# Altium footprint library connectors_micromatch.PcbLib: 36 footprints (part 1 of 3)
Each footprint in its own frame and in the unit in brackets; x right, y up, seen from the top. Pads: shape width x height; smd on the part's side, far side on the other; paste and mask are expansions set on the pad; w line width, h text height; cw(c..) or ccw(c..) is an arc to the next point about the centre after c.
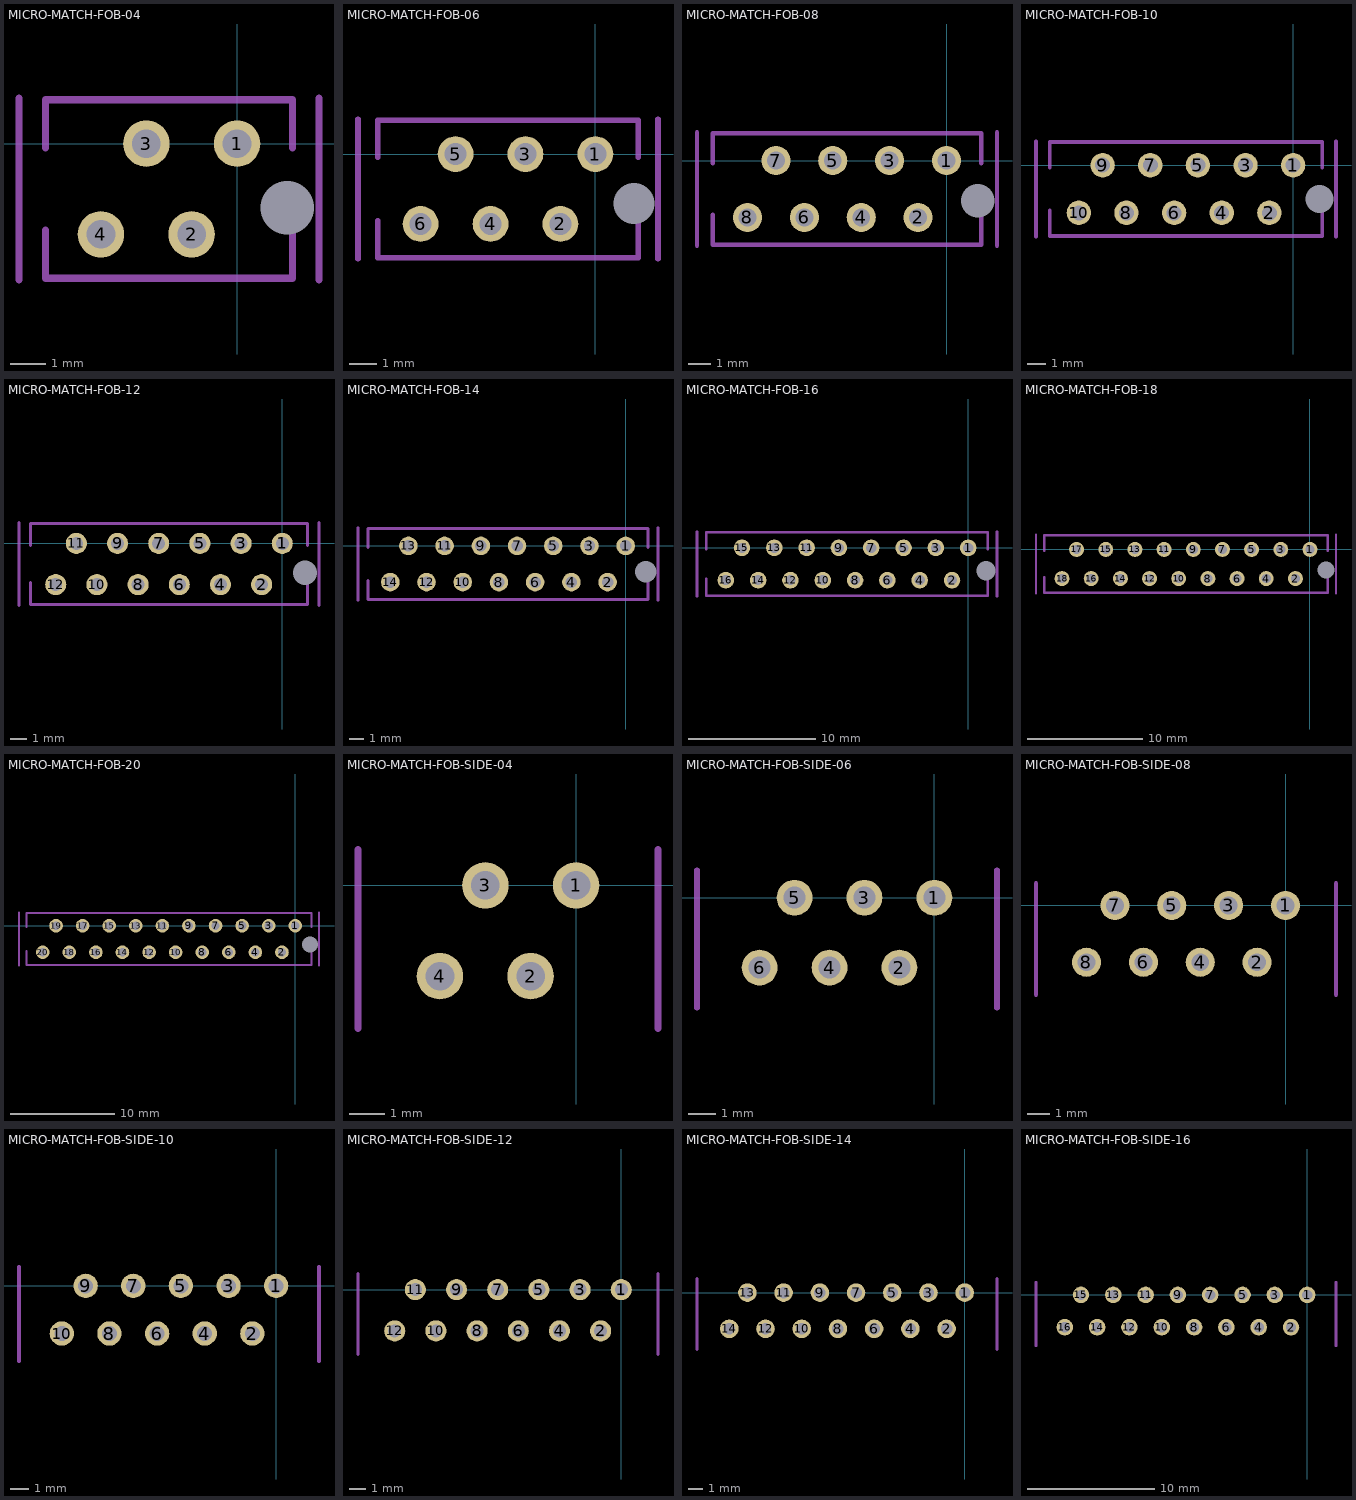
[diagram p0: the footprints below, top view; thin cyan lines are the x and y axes]

## MICRO-MATCH-FOB-04 [mm]
height 4
pads (5):
  round 1.3 hole 0.8: 1(0,0) 2(-1.27,-2.54) 3(-2.54,0) 4(-3.81,-2.54)
  round 0 hole 1.5 unplated: drill(1.4,-1.8)
Mechanical 13:
  lines w0.2: -6.105,-3.81 -6.105,1.27 ; -5.365,-2.42 -5.365,-3.77 1.555,-3.77 1.555,-2.42 ; -5.365,-0.12 -5.365,1.23 1.555,1.23 1.555,-0.12 ; 2.295,-3.81 2.295,1.27
3D body "micromatch_fob_4.STEP": height 4, standoff -3, extent -5.41,-3.77 1.6,1.23

## MICRO-MATCH-FOB-06 [mm]
height 4
pads (7):
  round 1.3 hole 0.8: 1(0,0) 2(-1.27,-2.54) 3(-2.54,0) 4(-3.81,-2.54) 5(-5.08,0) 6(-6.35,-2.54)
  round 0 hole 1.5 unplated: drill(1.4,-1.8)
Mechanical 13:
  lines w0.2: -8.625,-3.81 -8.625,1.27 ; -7.905,-2.42 -7.905,-3.77 1.555,-3.77 1.555,-2.42 ; -7.905,-0.12 -7.905,1.23 1.555,1.23 1.555,-0.12 ; 2.275,-3.81 2.275,1.27
3D body "micromatch_fob_6.STEP": height 4, standoff -3, extent -7.95,-3.77 1.6,1.23

## MICRO-MATCH-FOB-08 [mm]
height 4
pads (9):
  round 1.3 hole 0.8: 1(0,0) 2(-1.27,-2.54) 3(-2.54,0) 4(-3.81,-2.54) 5(-5.08,0) 6(-6.35,-2.54) 7(-7.62,0) 8(-8.89,-2.54)
  round 0 hole 1.5 unplated: drill(1.4,-1.8)
Mechanical 13:
  lines w0.2: -11.145,-3.81 -11.145,1.27 ; -10.445,-2.42 -10.445,-3.77 1.555,-3.77 1.555,-2.42 ; -10.445,-0.12 -10.445,1.23 1.555,1.23 1.555,-0.12 ; 2.255,-3.81 2.255,1.27
3D body "micromatch_fob_8.STEP": height 4, standoff -3, extent -10.49,-3.77 1.6,1.23

## MICRO-MATCH-FOB-10 [mm]
height 4
pads (11):
  round 1.3 hole 0.8: 1(0,0) 2(-1.27,-2.54) 3(-2.54,0) 4(-3.81,-2.54) 5(-5.08,0) 6(-6.35,-2.54) 7(-7.62,0) 8(-8.89,-2.54) 9(-10.16,0) 10(-11.43,-2.54)
  round 0 hole 1.5 unplated: drill(1.4,-1.8)
Mechanical 13:
  lines w0.2: -13.715,-3.81 -13.715,1.27 ; -12.985,-2.42 -12.985,-3.77 1.555,-3.77 1.555,-2.42 ; -12.985,-0.12 -12.985,1.23 1.555,1.23 1.555,-0.12 ; 2.285,-3.81 2.285,1.27
3D body "micromatch_fob_10.STEP": height 4, standoff -3, extent -13.03,-3.77 1.6,1.23

## MICRO-MATCH-FOB-12 [mm]
height 4
pads (13):
  round 1.3 hole 0.8: 1(0,0) 2(-1.27,-2.54) 3(-2.54,0) 4(-3.81,-2.54) 5(-5.08,0) 6(-6.35,-2.54) 7(-7.62,0) 8(-8.89,-2.54) 9(-10.16,0) 10(-11.43,-2.54) 11(-12.7,0) 12(-13.97,-2.54)
  round 0 hole 1.5 unplated: drill(1.4,-1.8)
Mechanical 13:
  lines w0.2: -16.235,-3.81 -16.235,1.27 ; -15.525,-2.42 -15.525,-3.77 1.555,-3.77 1.555,-2.42 ; -15.525,-0.12 -15.525,1.23 1.555,1.23 1.555,-0.12 ; 2.265,-3.81 2.265,1.27
3D body "micromatch_fob_12.STEP": height 4, standoff -3, extent -15.57,-3.77 1.6,1.23

## MICRO-MATCH-FOB-14 [mm]
height 4
pads (15):
  round 1.3 hole 0.8: 1(0,0) 2(-1.27,-2.54) 3(-2.54,0) 4(-3.81,-2.54) 5(-5.08,0) 6(-6.35,-2.54) 7(-7.62,0) 8(-8.89,-2.54) 9(-10.16,0) 10(-11.43,-2.54) 11(-12.7,0) 12(-13.97,-2.54) 13(-15.24,0) 14(-16.51,-2.54)
  round 0 hole 1.5 unplated: drill(1.4,-1.8)
Mechanical 13:
  lines w0.2: -18.775,-3.81 -18.775,1.27 ; -18.065,-2.42 -18.065,-3.77 1.555,-3.77 1.555,-2.42 ; -18.065,-0.12 -18.065,1.23 1.555,1.23 1.555,-0.12 ; 2.265,-3.81 2.265,1.27
3D body "micromatch_fob_14.STEP": height 4, standoff -3, extent -18.11,-3.77 1.6,1.23

## MICRO-MATCH-FOB-16 [mm]
height 4
pads (17):
  round 1.3 hole 0.8: 1(0,0) 2(-1.27,-2.54) 3(-2.54,0) 4(-3.81,-2.54) 5(-5.08,0) 6(-6.35,-2.54) 7(-7.62,0) 8(-8.89,-2.54) 9(-10.16,0) 10(-11.43,-2.54) 11(-12.7,0) 12(-13.97,-2.54) 13(-15.24,0) 14(-16.51,-2.54) 15(-17.78,0) 16(-19.05,-2.54)
  round 0 hole 1.5 unplated: drill(1.4,-1.8)
Mechanical 13:
  lines w0.2: -21.315,-3.81 -21.315,1.27 ; -20.605,-2.42 -20.605,-3.77 1.555,-3.77 1.555,-2.42 ; -20.605,-0.12 -20.605,1.23 1.555,1.23 1.555,-0.12 ; 2.265,-3.81 2.265,1.27
3D body "micromatch_fob_16.STEP": height 4, standoff -3, extent -20.65,-3.77 1.6,1.23

## MICRO-MATCH-FOB-18 [mm]
height 4
pads (19):
  round 1.3 hole 0.8: 1(0,0) 2(-1.27,-2.54) 3(-2.54,0) 4(-3.81,-2.54) 5(-5.08,0) 6(-6.35,-2.54) 7(-7.62,0) 8(-8.89,-2.54) 9(-10.16,0) 10(-11.43,-2.54) 11(-12.7,0) 12(-13.97,-2.54) 13(-15.24,0) 14(-16.51,-2.54) 15(-17.78,0) 16(-19.05,-2.54) 17(-20.32,0) 18(-21.59,-2.54)
  round 0 hole 1.5 unplated: drill(1.4,-1.8)
Mechanical 13:
  lines w0.2: -23.855,-3.81 -23.855,1.27 ; -23.145,-2.42 -23.145,-3.77 1.555,-3.77 1.555,-2.42 ; -23.145,-0.12 -23.145,1.23 1.555,1.23 1.555,-0.12 ; 2.265,-3.81 2.265,1.27
3D body "micromatch_fob_18.STEP": height 4, standoff -3, extent -23.19,-3.77 1.6,1.23

## MICRO-MATCH-FOB-20 [mm]
height 4
pads (21):
  round 1.3 hole 0.8: 1(0,0) 2(-1.27,-2.54) 3(-2.54,0) 4(-3.81,-2.54) 5(-5.08,0) 6(-6.35,-2.54) 7(-7.62,0) 8(-8.89,-2.54) 9(-10.16,0) 10(-11.43,-2.54) 11(-12.7,0) 12(-13.97,-2.54) 13(-15.24,0) 14(-16.51,-2.54) 15(-17.78,0) 16(-19.05,-2.54) 17(-20.32,0) 18(-21.59,-2.54) 19(-22.86,0) 20(-24.13,-2.54)
  round 0 hole 1.5 unplated: drill(1.4,-1.8)
Mechanical 13:
  lines w0.2: -26.395,-3.81 -26.395,1.27 ; -25.685,-2.42 -25.685,-3.77 1.555,-3.77 1.555,-2.42 ; -25.685,-0.12 -25.685,1.23 1.555,1.23 1.555,-0.12 ; 2.265,-3.81 2.265,1.27
3D body "micromatch_fob_20.STEP": height 4, standoff -3, extent -25.73,-3.77 1.6,1.23

## MICRO-MATCH-FOB-SIDE-04 [mm]
height 4
pads (4):
  round 1.3 hole 0.8: 1(0,0) 2(-1.27,-2.54) 3(-2.54,0) 4(-3.81,-2.54)
Mechanical 13:
  lines w0.2: -6.105,-4 -6.105,1 ; 2.295,-4 2.295,1
3D body "micromatch_fob_side_04.STEP": height 5.67, standoff -3.1, extent -5.41,-3.95 1.6,1.05

## MICRO-MATCH-FOB-SIDE-06 [mm]
height 4
pads (6):
  round 1.3 hole 0.8: 1(0,0) 2(-1.27,-2.54) 3(-2.54,0) 4(-3.81,-2.54) 5(-5.08,0) 6(-6.35,-2.54)
Mechanical 13:
  lines w0.2: -8.625,-4 -8.625,1 ; 2.275,-4 2.275,1
3D body "micromatch_fob_side_06.STEP": height 5.67, standoff -3.1, extent -7.95,-3.95 1.6,1.05

## MICRO-MATCH-FOB-SIDE-08 [mm]
height 4
pads (8):
  round 1.3 hole 0.8: 1(0,0) 2(-1.27,-2.54) 3(-2.54,0) 4(-3.81,-2.54) 5(-5.08,0) 6(-6.35,-2.54) 7(-7.62,0) 8(-8.89,-2.54)
Mechanical 13:
  lines w0.2: -11.145,-4 -11.145,1 ; 2.255,-4 2.255,1
3D body "micromatch_fob_side_08.STEP": height 5.67, standoff -3.1, extent -10.49,-3.95 1.6,1.05

## MICRO-MATCH-FOB-SIDE-10 [mm]
height 4
pads (10):
  round 1.3 hole 0.8: 1(0,0) 2(-1.27,-2.54) 3(-2.54,0) 4(-3.81,-2.54) 5(-5.08,0) 6(-6.35,-2.54) 7(-7.62,0) 8(-8.89,-2.54) 9(-10.16,0) 10(-11.43,-2.54)
Mechanical 13:
  lines w0.2: -13.715,-4 -13.715,1 ; 2.285,-4 2.285,1
3D body "micromatch_fob_side_10.STEP": height 5.67, standoff -3.1, extent -13.03,-3.95 1.6,1.05

## MICRO-MATCH-FOB-SIDE-12 [mm]
height 4
pads (12):
  round 1.3 hole 0.8: 1(0,0) 2(-1.27,-2.54) 3(-2.54,0) 4(-3.81,-2.54) 5(-5.08,0) 6(-6.35,-2.54) 7(-7.62,0) 8(-8.89,-2.54) 9(-10.16,0) 10(-11.43,-2.54) 11(-12.7,0) 12(-13.97,-2.54)
Mechanical 13:
  lines w0.2: -16.235,-4 -16.235,1 ; 2.265,-4 2.265,1
3D body "micromatch_fob_side_12.STEP": height 5.67, standoff -3.1, extent -15.57,-3.95 1.6,1.05

## MICRO-MATCH-FOB-SIDE-14 [mm]
height 4
pads (14):
  round 1.3 hole 0.8: 1(0,0) 2(-1.27,-2.54) 3(-2.54,0) 4(-3.81,-2.54) 5(-5.08,0) 6(-6.35,-2.54) 7(-7.62,0) 8(-8.89,-2.54) 9(-10.16,0) 10(-11.43,-2.54) 11(-12.7,0) 12(-13.97,-2.54) 13(-15.24,0) 14(-16.51,-2.54)
Mechanical 13:
  lines w0.2: -18.775,-4 -18.775,1 ; 2.265,-4 2.265,1
3D body "micromatch_fob_side_14.STEP": height 5.67, standoff -3.1, extent -18.11,-3.95 1.6,1.05

## MICRO-MATCH-FOB-SIDE-16 [mm]
height 4
pads (16):
  round 1.3 hole 0.8: 1(0,0) 2(-1.27,-2.54) 3(-2.54,0) 4(-3.81,-2.54) 5(-5.08,0) 6(-6.35,-2.54) 7(-7.62,0) 8(-8.89,-2.54) 9(-10.16,0) 10(-11.43,-2.54) 11(-12.7,0) 12(-13.97,-2.54) 13(-15.24,0) 14(-16.51,-2.54) 15(-17.78,0) 16(-19.05,-2.54)
Mechanical 13:
  lines w0.2: -21.315,-4 -21.315,1 ; 2.265,-4 2.265,1
3D body "micromatch_fob_side_16.STEP": height 5.67, standoff -3.1, extent -20.65,-3.95 1.6,1.05